# Altium footprint library Connector_Samtec_HLE_SMD.PcbLib: 290 footprints (part 9 of 24)
Each footprint in its own frame and in the unit in brackets; x right, y up, seen from the top. Pads: shape width x height; smd on the part's side, far side on the other; paste and mask are expansions set on the pad; w line width, h text height; cw(c..) or ccw(c..) is an arc to the next point about the centre after c.
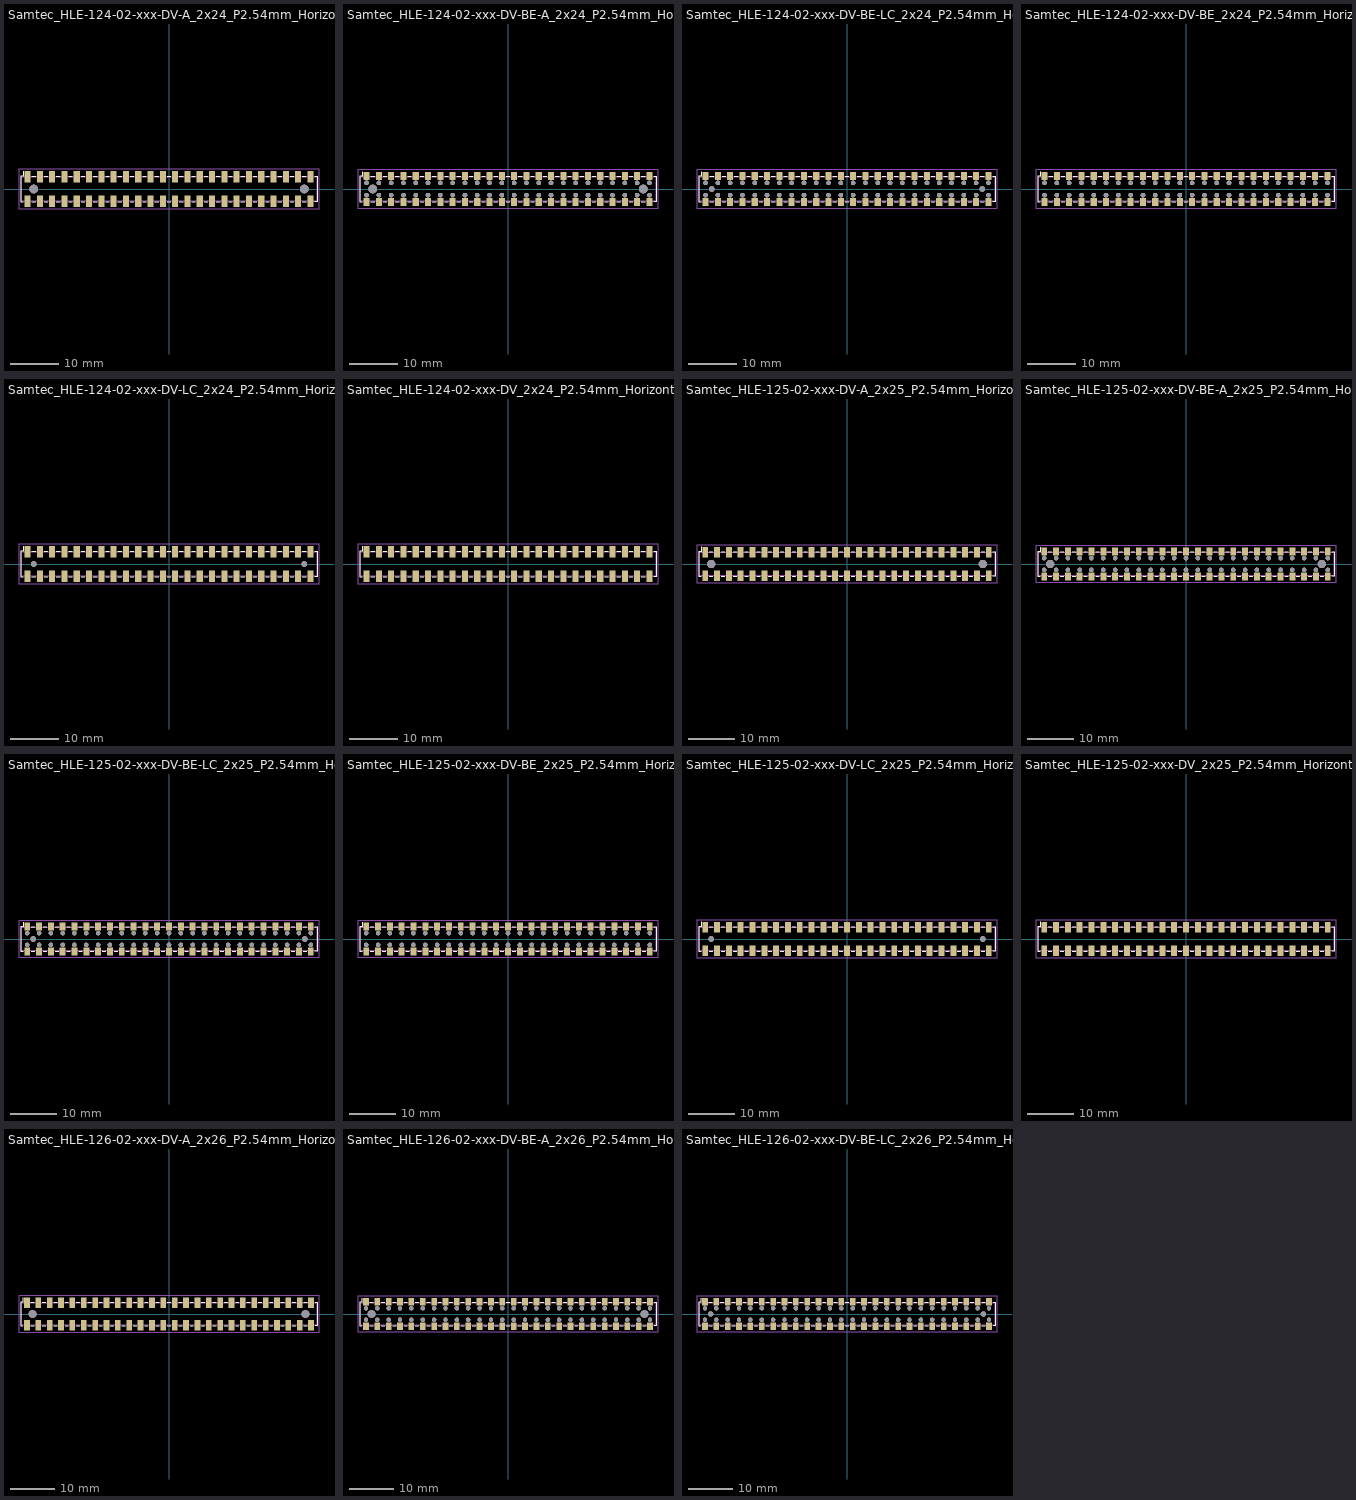
[diagram p8: the footprints below, top view; thin cyan lines are the x and y axes]

## Samtec_HLE-124-02-xxx-DV-A_2x24_P2.54mm_Horizontal [mm]
pads (50):
  rect 1.27x2.29 smd: 1(-29.21,2.525) 2(-29.21,-2.525) 3(-26.67,2.525) 4(-26.67,-2.525) 5(-24.13,2.525) 6(-24.13,-2.525) 7(-21.59,2.525) 8(-21.59,-2.525) 9(-19.05,2.525) 10(-19.05,-2.525) 11(-16.51,2.525) 12(-16.51,-2.525) 13(-13.97,2.525) 14(-13.97,-2.525) 15(-11.43,2.525) 16(-11.43,-2.525) 17(-8.89,2.525) 18(-8.89,-2.525) 19(-6.35,2.525) 20(-6.35,-2.525) 21(-3.81,2.525) 22(-3.81,-2.525) 23(-1.27,2.525) 24(-1.27,-2.525) 25(1.27,2.525) 26(1.27,-2.525) 27(3.81,2.525) 28(3.81,-2.525) 29(6.35,2.525) 30(6.35,-2.525) 31(8.89,2.525) 32(8.89,-2.525) 33(11.43,2.525) 34(11.43,-2.525) 35(13.97,2.525) 36(13.97,-2.525) 37(16.51,2.525) 38(16.51,-2.525) 39(19.05,2.525) 40(19.05,-2.525) 41(21.59,2.525) 42(21.59,-2.525) 43(24.13,2.525) 44(24.13,-2.525) 45(26.67,2.525) 46(26.67,-2.525) 47(29.21,2.525) 48(29.21,-2.525)
  round 1.78 hole 1.78: Un1(27.94,0) Un2(-27.94,0)
F.SilkS:
  lines w0.12: -30.105,-2.65 -30.59,-2.65 -30.59,2.65 -30.105,2.65 -30.105,3.67 ; -28.315,-2.65 -27.565,-2.65 ; -28.315,2.65 -27.565,2.65 ; -25.775,-2.65 -25.025,-2.65 ; -25.775,2.65 -25.025,2.65 ; -23.235,-2.65 -22.485,-2.65 ; -23.235,2.65 -22.485,2.65 ; -20.695,-2.65 -19.945,-2.65 ; -20.695,2.65 -19.945,2.65 ; -18.155,-2.65 -17.405,-2.65 ; -18.155,2.65 -17.405,2.65 ; -15.615,-2.65 -14.865,-2.65 ; -15.615,2.65 -14.865,2.65 ; -13.075,-2.65 -12.325,-2.65 ; -13.075,2.65 -12.325,2.65 ; -10.535,-2.65 -9.785,-2.65 ; -10.535,2.65 -9.785,2.65 ; -7.995,-2.65 -7.245,-2.65 ; -7.995,2.65 -7.245,2.65 ; -5.455,-2.65 -4.705,-2.65 ; -5.455,2.65 -4.705,2.65 ; -2.915,-2.65 -2.165,-2.65 ; -2.915,2.65 -2.165,2.65 ; -0.375,-2.65 0.375,-2.65 ; -0.375,2.65 0.375,2.65 ; 2.165,-2.65 2.915,-2.65 ; 2.165,2.65 2.915,2.65 ; 4.705,-2.65 5.455,-2.65 ; 4.705,2.65 5.455,2.65 ; 7.245,-2.65 7.995,-2.65 ; 7.245,2.65 7.995,2.65 ; 9.785,-2.65 10.535,-2.65 ; 9.785,2.65 10.535,2.65 ; 12.325,-2.65 13.075,-2.65 ; 12.325,2.65 13.075,2.65 ; 14.865,-2.65 15.615,-2.65 ; 14.865,2.65 15.615,2.65 ; 17.405,-2.65 18.155,-2.65 ; 17.405,2.65 18.155,2.65 ; 19.945,-2.65 20.695,-2.65 ; 19.945,2.65 20.695,2.65 ; 22.485,-2.65 23.235,-2.65 ; 22.485,2.65 23.235,2.65 ; 25.025,-2.65 25.775,-2.65 ; 25.025,2.65 25.775,2.65 ; 27.565,-2.65 28.315,-2.65 ; 27.565,2.65 28.315,2.65 ; 30.105,-2.65 30.59,-2.65 30.59,2.65 30.105,2.65
F.CrtYd:
  lines w0.05: -30.98,-4.17 30.98,-4.17 30.98,4.17 -30.98,4.17 -30.98,-4.17
F.Fab:
  lines w0.1: -29.71,2.54 -29.21,1.833 -28.71,2.54 ; -30.48,-2.54 30.48,-2.54 30.48,2.54 -30.48,2.54 -30.48,-2.54
  text "'.Designator'" at -4.047,-2.68 h1

## Samtec_HLE-124-02-xxx-DV-BE-A_2x24_P2.54mm_Horizontal [mm]
pads (98):
  rect 1.27x1.68 smd: 1(-29.21,2.72) 2(-29.21,-2.72) 3(-26.67,2.72) 4(-26.67,-2.72) 5(-24.13,2.72) 6(-24.13,-2.72) 7(-21.59,2.72) 8(-21.59,-2.72) 9(-19.05,2.72) 10(-19.05,-2.72) 11(-16.51,2.72) 12(-16.51,-2.72) 13(-13.97,2.72) 14(-13.97,-2.72) 15(-11.43,2.72) 16(-11.43,-2.72) 17(-8.89,2.72) 18(-8.89,-2.72) 19(-6.35,2.72) 20(-6.35,-2.72) 21(-3.81,2.72) 22(-3.81,-2.72) 23(-1.27,2.72) 24(-1.27,-2.72) 25(1.27,2.72) 26(1.27,-2.72) 27(3.81,2.72) 28(3.81,-2.72) 29(6.35,2.72) 30(6.35,-2.72) 31(8.89,2.72) 32(8.89,-2.72) 33(11.43,2.72) 34(11.43,-2.72) 35(13.97,2.72) 36(13.97,-2.72) 37(16.51,2.72) 38(16.51,-2.72) 39(19.05,2.72) 40(19.05,-2.72) 41(21.59,2.72) 42(21.59,-2.72) 43(24.13,2.72) 44(24.13,-2.72) 45(26.67,2.72) 46(26.67,-2.72) 47(29.21,2.72) 48(29.21,-2.72)
  round 0.97 hole 0.97: Un1(-13.97,-1.27) Un2(1.27,1.27) Un3(24.13,1.27) Un4(24.13,-1.27) Un5(-16.51,1.27) Un7(6.35,1.27) Un8(29.21,1.27) Un9(-6.35,1.27) Un11(8.89,1.27) Un12(3.81,1.27) Un13(19.05,-1.27) Un14(-29.21,-1.27) Un15(11.43,1.27) Un16(-29.21,1.27) Un17(-21.59,-1.27) Un18(3.81,-1.27) Un19(-19.05,-1.27) Un20(-8.89,1.27) Un21(-8.89,-1.27) Un22(16.51,1.27) Un23(-16.51,-1.27) Un24(-24.13,-1.27) Un25(1.27,-1.27) Un26(21.59,1.27) Un27(26.67,-1.27) Un28(-26.67,1.27) Un29(-1.27,1.27) Un30(21.59,-1.27) Un31(-11.43,-1.27) Un32(8.89,-1.27) Un33(13.97,1.27) Un34(-1.27,-1.27) Un35(-11.43,1.27) Un36(16.51,-1.27) Un37(26.67,1.27) Un38(-6.35,-1.27) Un39(-26.67,-1.27) Un40(13.97,-1.27) Un41(11.43,-1.27) Un42(6.35,-1.27) Un43(-24.13,1.27) Un44(29.21,-1.27) Un45(-3.81,1.27) Un46(-19.05,1.27) Un47(-3.81,-1.27) Un48(19.05,1.27) Un49(-21.59,1.27) Un50(-13.97,1.27)
  round 1.78 hole 1.78: Un6(-27.94,0) Un10(27.94,0)
F.SilkS:
  lines w0.12: -30.105,-2.65 -30.59,-2.65 -30.59,2.65 -30.105,2.65 -30.105,3.56 ; -28.315,-2.65 -27.565,-2.65 ; -28.315,2.65 -27.565,2.65 ; -25.775,-2.65 -25.025,-2.65 ; -25.775,2.65 -25.025,2.65 ; -23.235,-2.65 -22.485,-2.65 ; -23.235,2.65 -22.485,2.65 ; -20.695,-2.65 -19.945,-2.65 ; -20.695,2.65 -19.945,2.65 ; -18.155,-2.65 -17.405,-2.65 ; -18.155,2.65 -17.405,2.65 ; -15.615,-2.65 -14.865,-2.65 ; -15.615,2.65 -14.865,2.65 ; -13.075,-2.65 -12.325,-2.65 ; -13.075,2.65 -12.325,2.65 ; -10.535,-2.65 -9.785,-2.65 ; -10.535,2.65 -9.785,2.65 ; -7.995,-2.65 -7.245,-2.65 ; -7.995,2.65 -7.245,2.65 ; -5.455,-2.65 -4.705,-2.65 ; -5.455,2.65 -4.705,2.65 ; -2.915,-2.65 -2.165,-2.65 ; -2.915,2.65 -2.165,2.65 ; -0.375,-2.65 0.375,-2.65 ; -0.375,2.65 0.375,2.65 ; 2.165,-2.65 2.915,-2.65 ; 2.165,2.65 2.915,2.65 ; 4.705,-2.65 5.455,-2.65 ; 4.705,2.65 5.455,2.65 ; 7.245,-2.65 7.995,-2.65 ; 7.245,2.65 7.995,2.65 ; 9.785,-2.65 10.535,-2.65 ; 9.785,2.65 10.535,2.65 ; 12.325,-2.65 13.075,-2.65 ; 12.325,2.65 13.075,2.65 ; 14.865,-2.65 15.615,-2.65 ; 14.865,2.65 15.615,2.65 ; 17.405,-2.65 18.155,-2.65 ; 17.405,2.65 18.155,2.65 ; 19.945,-2.65 20.695,-2.65 ; 19.945,2.65 20.695,2.65 ; 22.485,-2.65 23.235,-2.65 ; 22.485,2.65 23.235,2.65 ; 25.025,-2.65 25.775,-2.65 ; 25.025,2.65 25.775,2.65 ; 27.565,-2.65 28.315,-2.65 ; 27.565,2.65 28.315,2.65 ; 30.105,-2.65 30.59,-2.65 30.59,2.65 30.105,2.65
F.CrtYd:
  lines w0.05: -30.98,-4.06 30.98,-4.06 30.98,4.06 -30.98,4.06 -30.98,-4.06
F.Fab:
  lines w0.1: -29.71,2.54 -29.21,1.833 -28.71,2.54 ; -30.48,-2.54 -30.48,2.54 30.48,2.54 30.48,-2.54 -30.48,-2.54
  text "'.Designator'" at -4.047,-2.68 h1

## Samtec_HLE-124-02-xxx-DV-BE-LC_2x24_P2.54mm_Horizontal [mm]
pads (98):
  rect 1.27x1.68 smd: 1(-29.21,2.72) 2(-29.21,-2.72) 3(-26.67,2.72) 4(-26.67,-2.72) 5(-24.13,2.72) 6(-24.13,-2.72) 7(-21.59,2.72) 8(-21.59,-2.72) 9(-19.05,2.72) 10(-19.05,-2.72) 11(-16.51,2.72) 12(-16.51,-2.72) 13(-13.97,2.72) 14(-13.97,-2.72) 15(-11.43,2.72) 16(-11.43,-2.72) 17(-8.89,2.72) 18(-8.89,-2.72) 19(-6.35,2.72) 20(-6.35,-2.72) 21(-3.81,2.72) 22(-3.81,-2.72) 23(-1.27,2.72) 24(-1.27,-2.72) 25(1.27,2.72) 26(1.27,-2.72) 27(3.81,2.72) 28(3.81,-2.72) 29(6.35,2.72) 30(6.35,-2.72) 31(8.89,2.72) 32(8.89,-2.72) 33(11.43,2.72) 34(11.43,-2.72) 35(13.97,2.72) 36(13.97,-2.72) 37(16.51,2.72) 38(16.51,-2.72) 39(19.05,2.72) 40(19.05,-2.72) 41(21.59,2.72) 42(21.59,-2.72) 43(24.13,2.72) 44(24.13,-2.72) 45(26.67,2.72) 46(26.67,-2.72) 47(29.21,2.72) 48(29.21,-2.72)
  round 0.97 hole 0.97: Un1(-3.81,1.27) Un2(1.27,-1.27) Un3(24.13,-1.27) Un4(-19.05,-1.27) Un5(24.13,1.27) Un6(-1.27,1.27) Un7(1.27,1.27) Un8(-11.43,-1.27) Un9(-21.59,1.27) Un10(-13.97,1.27) Un11(-13.97,-1.27) Un12(21.59,-1.27) Un13(6.35,1.27) Un14(8.89,-1.27) Un15(-11.43,1.27) Un16(-6.35,-1.27) Un17(-24.13,1.27) Un18(13.97,-1.27) Un19(-26.67,1.27) Un20(-3.81,-1.27) Un21(-26.67,-1.27) Un22(3.81,-1.27) Un24(29.21,-1.27) Un25(11.43,-1.27) Un26(26.67,-1.27) Un27(-16.51,1.27) Un28(3.81,1.27) Un29(-16.51,-1.27) Un30(16.51,1.27) Un31(-29.21,-1.27) Un32(6.35,-1.27) Un33(-6.35,1.27) Un34(11.43,1.27) Un35(29.21,1.27) Un36(-21.59,-1.27) Un37(13.97,1.27) Un38(-19.05,1.27) Un39(-24.13,-1.27) Un40(19.05,-1.27) Un42(19.05,1.27) Un43(-8.89,1.27) Un44(-29.21,1.27) Un45(-8.89,-1.27) Un46(16.51,-1.27) Un47(26.67,1.27) Un48(-1.27,-1.27) Un49(8.89,1.27) Un50(21.59,1.27)
  round 1.19 hole 1.19: Un23(-27.94,0) Un41(27.94,0)
F.SilkS:
  lines w0.12: -30.105,-2.65 -30.59,-2.65 -30.59,2.65 -30.105,2.65 -30.105,3.56 ; -28.315,-2.65 -27.565,-2.65 ; -28.315,2.65 -27.565,2.65 ; -25.775,-2.65 -25.025,-2.65 ; -25.775,2.65 -25.025,2.65 ; -23.235,-2.65 -22.485,-2.65 ; -23.235,2.65 -22.485,2.65 ; -20.695,-2.65 -19.945,-2.65 ; -20.695,2.65 -19.945,2.65 ; -18.155,-2.65 -17.405,-2.65 ; -18.155,2.65 -17.405,2.65 ; -15.615,-2.65 -14.865,-2.65 ; -15.615,2.65 -14.865,2.65 ; -13.075,-2.65 -12.325,-2.65 ; -13.075,2.65 -12.325,2.65 ; -10.535,-2.65 -9.785,-2.65 ; -10.535,2.65 -9.785,2.65 ; -7.995,-2.65 -7.245,-2.65 ; -7.995,2.65 -7.245,2.65 ; -5.455,-2.65 -4.705,-2.65 ; -5.455,2.65 -4.705,2.65 ; -2.915,-2.65 -2.165,-2.65 ; -2.915,2.65 -2.165,2.65 ; -0.375,-2.65 0.375,-2.65 ; -0.375,2.65 0.375,2.65 ; 2.165,-2.65 2.915,-2.65 ; 2.165,2.65 2.915,2.65 ; 4.705,-2.65 5.455,-2.65 ; 4.705,2.65 5.455,2.65 ; 7.245,-2.65 7.995,-2.65 ; 7.245,2.65 7.995,2.65 ; 9.785,-2.65 10.535,-2.65 ; 9.785,2.65 10.535,2.65 ; 12.325,-2.65 13.075,-2.65 ; 12.325,2.65 13.075,2.65 ; 14.865,-2.65 15.615,-2.65 ; 14.865,2.65 15.615,2.65 ; 17.405,-2.65 18.155,-2.65 ; 17.405,2.65 18.155,2.65 ; 19.945,-2.65 20.695,-2.65 ; 19.945,2.65 20.695,2.65 ; 22.485,-2.65 23.235,-2.65 ; 22.485,2.65 23.235,2.65 ; 25.025,-2.65 25.775,-2.65 ; 25.025,2.65 25.775,2.65 ; 27.565,-2.65 28.315,-2.65 ; 27.565,2.65 28.315,2.65 ; 30.105,-2.65 30.59,-2.65 30.59,2.65 30.105,2.65
F.CrtYd:
  lines w0.05: -30.98,-4.06 -30.98,4.06 30.98,4.06 30.98,-4.06 -30.98,-4.06
F.Fab:
  lines w0.1: -29.71,2.54 -29.21,1.833 -28.71,2.54 ; -30.48,-2.54 -30.48,2.54 30.48,2.54 30.48,-2.54 -30.48,-2.54
  text "'.Designator'" at -4.047,-2.68 h1

## Samtec_HLE-124-02-xxx-DV-BE_2x24_P2.54mm_Horizontal [mm]
pads (96):
  rect 1.27x1.68 smd: 1(-29.21,2.72) 2(-29.21,-2.72) 3(-26.67,2.72) 4(-26.67,-2.72) 5(-24.13,2.72) 6(-24.13,-2.72) 7(-21.59,2.72) 8(-21.59,-2.72) 9(-19.05,2.72) 10(-19.05,-2.72) 11(-16.51,2.72) 12(-16.51,-2.72) 13(-13.97,2.72) 14(-13.97,-2.72) 15(-11.43,2.72) 16(-11.43,-2.72) 17(-8.89,2.72) 18(-8.89,-2.72) 19(-6.35,2.72) 20(-6.35,-2.72) 21(-3.81,2.72) 22(-3.81,-2.72) 23(-1.27,2.72) 24(-1.27,-2.72) 25(1.27,2.72) 26(1.27,-2.72) 27(3.81,2.72) 28(3.81,-2.72) 29(6.35,2.72) 30(6.35,-2.72) 31(8.89,2.72) 32(8.89,-2.72) 33(11.43,2.72) 34(11.43,-2.72) 35(13.97,2.72) 36(13.97,-2.72) 37(16.51,2.72) 38(16.51,-2.72) 39(19.05,2.72) 40(19.05,-2.72) 41(21.59,2.72) 42(21.59,-2.72) 43(24.13,2.72) 44(24.13,-2.72) 45(26.67,2.72) 46(26.67,-2.72) 47(29.21,2.72) 48(29.21,-2.72)
  round 0.97 hole 0.97: Un1(3.81,1.27) Un2(-24.13,-1.27) Un3(11.43,-1.27) Un4(13.97,-1.27) Un5(11.43,1.27) Un6(-1.27,1.27) Un7(-3.81,1.27) Un8(-19.05,-1.27) Un9(19.05,1.27) Un10(-24.13,1.27) Un11(1.27,-1.27) Un12(16.51,1.27) Un13(-11.43,1.27) Un14(6.35,1.27) Un15(13.97,1.27) Un16(-8.89,1.27) Un17(8.89,1.27) Un18(21.59,1.27) Un19(-29.21,-1.27) Un20(-13.97,1.27) Un21(-21.59,1.27) Un22(-3.81,-1.27) Un23(29.21,-1.27) Un24(29.21,1.27) Un25(-19.05,1.27) Un26(24.13,1.27) Un27(6.35,-1.27) Un28(-26.67,-1.27) Un29(-16.51,-1.27) Un30(-6.35,-1.27) Un31(-21.59,-1.27) Un32(16.51,-1.27) Un33(1.27,1.27) Un34(26.67,1.27) Un35(8.89,-1.27) Un36(24.13,-1.27) Un37(-1.27,-1.27) Un38(-8.89,-1.27) Un39(-26.67,1.27) Un40(-29.21,1.27) Un41(19.05,-1.27) Un42(3.81,-1.27) Un43(-6.35,1.27) Un44(21.59,-1.27) Un45(26.67,-1.27) Un46(-11.43,-1.27) Un47(-13.97,-1.27) Un48(-16.51,1.27)
F.SilkS:
  lines w0.12: -30.105,-2.65 -30.59,-2.65 -30.59,2.65 -30.105,2.65 -30.105,3.56 ; -28.315,-2.65 -27.565,-2.65 ; -28.315,2.65 -27.565,2.65 ; -25.775,-2.65 -25.025,-2.65 ; -25.775,2.65 -25.025,2.65 ; -23.235,-2.65 -22.485,-2.65 ; -23.235,2.65 -22.485,2.65 ; -20.695,-2.65 -19.945,-2.65 ; -20.695,2.65 -19.945,2.65 ; -18.155,-2.65 -17.405,-2.65 ; -18.155,2.65 -17.405,2.65 ; -15.615,-2.65 -14.865,-2.65 ; -15.615,2.65 -14.865,2.65 ; -13.075,-2.65 -12.325,-2.65 ; -13.075,2.65 -12.325,2.65 ; -10.535,-2.65 -9.785,-2.65 ; -10.535,2.65 -9.785,2.65 ; -7.995,-2.65 -7.245,-2.65 ; -7.995,2.65 -7.245,2.65 ; -5.455,-2.65 -4.705,-2.65 ; -5.455,2.65 -4.705,2.65 ; -2.915,-2.65 -2.165,-2.65 ; -2.915,2.65 -2.165,2.65 ; -0.375,-2.65 0.375,-2.65 ; -0.375,2.65 0.375,2.65 ; 2.165,-2.65 2.915,-2.65 ; 2.165,2.65 2.915,2.65 ; 4.705,-2.65 5.455,-2.65 ; 4.705,2.65 5.455,2.65 ; 7.245,-2.65 7.995,-2.65 ; 7.245,2.65 7.995,2.65 ; 9.785,-2.65 10.535,-2.65 ; 9.785,2.65 10.535,2.65 ; 12.325,-2.65 13.075,-2.65 ; 12.325,2.65 13.075,2.65 ; 14.865,-2.65 15.615,-2.65 ; 14.865,2.65 15.615,2.65 ; 17.405,-2.65 18.155,-2.65 ; 17.405,2.65 18.155,2.65 ; 19.945,-2.65 20.695,-2.65 ; 19.945,2.65 20.695,2.65 ; 22.485,-2.65 23.235,-2.65 ; 22.485,2.65 23.235,2.65 ; 25.025,-2.65 25.775,-2.65 ; 25.025,2.65 25.775,2.65 ; 27.565,-2.65 28.315,-2.65 ; 27.565,2.65 28.315,2.65 ; 30.105,-2.65 30.59,-2.65 30.59,2.65 30.105,2.65
F.CrtYd:
  lines w0.05: -30.98,-4.06 -30.98,4.06 30.98,4.06 30.98,-4.06 -30.98,-4.06
F.Fab:
  lines w0.1: -29.71,2.54 -29.21,1.833 -28.71,2.54 ; -30.48,-2.54 -30.48,2.54 30.48,2.54 30.48,-2.54 -30.48,-2.54
  text "'.Designator'" at -4.047,-2.68 h1

## Samtec_HLE-124-02-xxx-DV-LC_2x24_P2.54mm_Horizontal [mm]
pads (50):
  rect 1.27x2.29 smd: 1(-29.21,2.525) 2(-29.21,-2.525) 3(-26.67,2.525) 4(-26.67,-2.525) 5(-24.13,2.525) 6(-24.13,-2.525) 7(-21.59,2.525) 8(-21.59,-2.525) 9(-19.05,2.525) 10(-19.05,-2.525) 11(-16.51,2.525) 12(-16.51,-2.525) 13(-13.97,2.525) 14(-13.97,-2.525) 15(-11.43,2.525) 16(-11.43,-2.525) 17(-8.89,2.525) 18(-8.89,-2.525) 19(-6.35,2.525) 20(-6.35,-2.525) 21(-3.81,2.525) 22(-3.81,-2.525) 23(-1.27,2.525) 24(-1.27,-2.525) 25(1.27,2.525) 26(1.27,-2.525) 27(3.81,2.525) 28(3.81,-2.525) 29(6.35,2.525) 30(6.35,-2.525) 31(8.89,2.525) 32(8.89,-2.525) 33(11.43,2.525) 34(11.43,-2.525) 35(13.97,2.525) 36(13.97,-2.525) 37(16.51,2.525) 38(16.51,-2.525) 39(19.05,2.525) 40(19.05,-2.525) 41(21.59,2.525) 42(21.59,-2.525) 43(24.13,2.525) 44(24.13,-2.525) 45(26.67,2.525) 46(26.67,-2.525) 47(29.21,2.525) 48(29.21,-2.525)
  round 1.19 hole 1.19: Un1(-27.94,0) Un2(27.94,0)
F.SilkS:
  lines w0.12: -30.105,-2.65 -30.59,-2.65 -30.59,2.65 -30.105,2.65 -30.105,3.67 ; -28.315,-2.65 -27.565,-2.65 ; -28.315,2.65 -27.565,2.65 ; -25.775,-2.65 -25.025,-2.65 ; -25.775,2.65 -25.025,2.65 ; -23.235,-2.65 -22.485,-2.65 ; -23.235,2.65 -22.485,2.65 ; -20.695,-2.65 -19.945,-2.65 ; -20.695,2.65 -19.945,2.65 ; -18.155,-2.65 -17.405,-2.65 ; -18.155,2.65 -17.405,2.65 ; -15.615,-2.65 -14.865,-2.65 ; -15.615,2.65 -14.865,2.65 ; -13.075,-2.65 -12.325,-2.65 ; -13.075,2.65 -12.325,2.65 ; -10.535,-2.65 -9.785,-2.65 ; -10.535,2.65 -9.785,2.65 ; -7.995,-2.65 -7.245,-2.65 ; -7.995,2.65 -7.245,2.65 ; -5.455,-2.65 -4.705,-2.65 ; -5.455,2.65 -4.705,2.65 ; -2.915,-2.65 -2.165,-2.65 ; -2.915,2.65 -2.165,2.65 ; -0.375,-2.65 0.375,-2.65 ; -0.375,2.65 0.375,2.65 ; 2.165,-2.65 2.915,-2.65 ; 2.165,2.65 2.915,2.65 ; 4.705,-2.65 5.455,-2.65 ; 4.705,2.65 5.455,2.65 ; 7.245,-2.65 7.995,-2.65 ; 7.245,2.65 7.995,2.65 ; 9.785,-2.65 10.535,-2.65 ; 9.785,2.65 10.535,2.65 ; 12.325,-2.65 13.075,-2.65 ; 12.325,2.65 13.075,2.65 ; 14.865,-2.65 15.615,-2.65 ; 14.865,2.65 15.615,2.65 ; 17.405,-2.65 18.155,-2.65 ; 17.405,2.65 18.155,2.65 ; 19.945,-2.65 20.695,-2.65 ; 19.945,2.65 20.695,2.65 ; 22.485,-2.65 23.235,-2.65 ; 22.485,2.65 23.235,2.65 ; 25.025,-2.65 25.775,-2.65 ; 25.025,2.65 25.775,2.65 ; 27.565,-2.65 28.315,-2.65 ; 27.565,2.65 28.315,2.65 ; 30.105,-2.65 30.59,-2.65 30.59,2.65 30.105,2.65
F.CrtYd:
  lines w0.05: -30.98,-4.17 -30.98,4.17 30.98,4.17 30.98,-4.17 -30.98,-4.17
F.Fab:
  lines w0.1: -29.71,2.54 -29.21,1.833 -28.71,2.54 ; -30.48,-2.54 30.48,-2.54 30.48,2.54 -30.48,2.54 -30.48,-2.54
  text "'.Designator'" at -4.047,-2.68 h1

## Samtec_HLE-124-02-xxx-DV_2x24_P2.54mm_Horizontal [mm]
pads (48):
  rect 1.27x2.29 smd: 1(-29.21,2.525) 2(-29.21,-2.525) 3(-26.67,2.525) 4(-26.67,-2.525) 5(-24.13,2.525) 6(-24.13,-2.525) 7(-21.59,2.525) 8(-21.59,-2.525) 9(-19.05,2.525) 10(-19.05,-2.525) 11(-16.51,2.525) 12(-16.51,-2.525) 13(-13.97,2.525) 14(-13.97,-2.525) 15(-11.43,2.525) 16(-11.43,-2.525) 17(-8.89,2.525) 18(-8.89,-2.525) 19(-6.35,2.525) 20(-6.35,-2.525) 21(-3.81,2.525) 22(-3.81,-2.525) 23(-1.27,2.525) 24(-1.27,-2.525) 25(1.27,2.525) 26(1.27,-2.525) 27(3.81,2.525) 28(3.81,-2.525) 29(6.35,2.525) 30(6.35,-2.525) 31(8.89,2.525) 32(8.89,-2.525) 33(11.43,2.525) 34(11.43,-2.525) 35(13.97,2.525) 36(13.97,-2.525) 37(16.51,2.525) 38(16.51,-2.525) 39(19.05,2.525) 40(19.05,-2.525) 41(21.59,2.525) 42(21.59,-2.525) 43(24.13,2.525) 44(24.13,-2.525) 45(26.67,2.525) 46(26.67,-2.525) 47(29.21,2.525) 48(29.21,-2.525)
F.SilkS:
  lines w0.12: -30.105,-2.65 -30.59,-2.65 -30.59,2.65 -30.105,2.65 -30.105,3.67 ; -28.315,-2.65 -27.565,-2.65 ; -28.315,2.65 -27.565,2.65 ; -25.775,-2.65 -25.025,-2.65 ; -25.775,2.65 -25.025,2.65 ; -23.235,-2.65 -22.485,-2.65 ; -23.235,2.65 -22.485,2.65 ; -20.695,-2.65 -19.945,-2.65 ; -20.695,2.65 -19.945,2.65 ; -18.155,-2.65 -17.405,-2.65 ; -18.155,2.65 -17.405,2.65 ; -15.615,-2.65 -14.865,-2.65 ; -15.615,2.65 -14.865,2.65 ; -13.075,-2.65 -12.325,-2.65 ; -13.075,2.65 -12.325,2.65 ; -10.535,-2.65 -9.785,-2.65 ; -10.535,2.65 -9.785,2.65 ; -7.995,-2.65 -7.245,-2.65 ; -7.995,2.65 -7.245,2.65 ; -5.455,-2.65 -4.705,-2.65 ; -5.455,2.65 -4.705,2.65 ; -2.915,-2.65 -2.165,-2.65 ; -2.915,2.65 -2.165,2.65 ; -0.375,-2.65 0.375,-2.65 ; -0.375,2.65 0.375,2.65 ; 2.165,-2.65 2.915,-2.65 ; 2.165,2.65 2.915,2.65 ; 4.705,-2.65 5.455,-2.65 ; 4.705,2.65 5.455,2.65 ; 7.245,-2.65 7.995,-2.65 ; 7.245,2.65 7.995,2.65 ; 9.785,-2.65 10.535,-2.65 ; 9.785,2.65 10.535,2.65 ; 12.325,-2.65 13.075,-2.65 ; 12.325,2.65 13.075,2.65 ; 14.865,-2.65 15.615,-2.65 ; 14.865,2.65 15.615,2.65 ; 17.405,-2.65 18.155,-2.65 ; 17.405,2.65 18.155,2.65 ; 19.945,-2.65 20.695,-2.65 ; 19.945,2.65 20.695,2.65 ; 22.485,-2.65 23.235,-2.65 ; 22.485,2.65 23.235,2.65 ; 25.025,-2.65 25.775,-2.65 ; 25.025,2.65 25.775,2.65 ; 27.565,-2.65 28.315,-2.65 ; 27.565,2.65 28.315,2.65 ; 30.105,-2.65 30.59,-2.65 30.59,2.65 30.105,2.65
F.CrtYd:
  lines w0.05: -30.98,-4.17 30.98,-4.17 30.98,4.17 -30.98,4.17 -30.98,-4.17
F.Fab:
  lines w0.1: -29.71,2.54 -29.21,1.833 -28.71,2.54 ; -30.48,-2.54 30.48,-2.54 30.48,2.54 -30.48,2.54 -30.48,-2.54
  text "'.Designator'" at -4.047,-2.68 h1

## Samtec_HLE-125-02-xxx-DV-A_2x25_P2.54mm_Horizontal [mm]
pads (52):
  rect 1.27x2.29 smd: 1(-30.48,2.525) 2(-30.48,-2.525) 3(-27.94,2.525) 4(-27.94,-2.525) 5(-25.4,2.525) 6(-25.4,-2.525) 7(-22.86,2.525) 8(-22.86,-2.525) 9(-20.32,2.525) 10(-20.32,-2.525) 11(-17.78,2.525) 12(-17.78,-2.525) 13(-15.24,2.525) 14(-15.24,-2.525) 15(-12.7,2.525) 16(-12.7,-2.525) 17(-10.16,2.525) 18(-10.16,-2.525) 19(-7.62,2.525) 20(-7.62,-2.525) 21(-5.08,2.525) 22(-5.08,-2.525) 23(-2.54,2.525) 24(-2.54,-2.525) 25(0,2.525) 26(0,-2.525) 27(2.54,2.525) 28(2.54,-2.525) 29(5.08,2.525) 30(5.08,-2.525) 31(7.62,2.525) 32(7.62,-2.525) 33(10.16,2.525) 34(10.16,-2.525) 35(12.7,2.525) 36(12.7,-2.525) 37(15.24,2.525) 38(15.24,-2.525) 39(17.78,2.525) 40(17.78,-2.525) 41(20.32,2.525) 42(20.32,-2.525) 43(22.86,2.525) 44(22.86,-2.525) 45(25.4,2.525) 46(25.4,-2.525) 47(27.94,2.525) 48(27.94,-2.525) 49(30.48,2.525) 50(30.48,-2.525)
  round 1.78 hole 1.78: Un1(-29.21,0) Un2(29.21,0)
F.SilkS:
  lines w0.12: -31.375,-2.65 -31.86,-2.65 -31.86,2.65 -31.375,2.65 -31.375,3.67 ; -29.585,-2.65 -28.835,-2.65 ; -29.585,2.65 -28.835,2.65 ; -27.045,-2.65 -26.295,-2.65 ; -27.045,2.65 -26.295,2.65 ; -24.505,-2.65 -23.755,-2.65 ; -24.505,2.65 -23.755,2.65 ; -21.965,-2.65 -21.215,-2.65 ; -21.965,2.65 -21.215,2.65 ; -19.425,-2.65 -18.675,-2.65 ; -19.425,2.65 -18.675,2.65 ; -16.885,-2.65 -16.135,-2.65 ; -16.885,2.65 -16.135,2.65 ; -14.345,-2.65 -13.595,-2.65 ; -14.345,2.65 -13.595,2.65 ; -11.805,-2.65 -11.055,-2.65 ; -11.805,2.65 -11.055,2.65 ; -9.265,-2.65 -8.515,-2.65 ; -9.265,2.65 -8.515,2.65 ; -6.725,-2.65 -5.975,-2.65 ; -6.725,2.65 -5.975,2.65 ; -4.185,-2.65 -3.435,-2.65 ; -4.185,2.65 -3.435,2.65 ; -1.645,-2.65 -0.895,-2.65 ; -1.645,2.65 -0.895,2.65 ; 0.895,-2.65 1.645,-2.65 ; 0.895,2.65 1.645,2.65 ; 3.435,-2.65 4.185,-2.65 ; 3.435,2.65 4.185,2.65 ; 5.975,-2.65 6.725,-2.65 ; 5.975,2.65 6.725,2.65 ; 8.515,-2.65 9.265,-2.65 ; 8.515,2.65 9.265,2.65 ; 11.055,-2.65 11.805,-2.65 ; 11.055,2.65 11.805,2.65 ; 13.595,-2.65 14.345,-2.65 ; 13.595,2.65 14.345,2.65 ; 16.135,-2.65 16.885,-2.65 ; 16.135,2.65 16.885,2.65 ; 18.675,-2.65 19.425,-2.65 ; 18.675,2.65 19.425,2.65 ; 21.215,-2.65 21.965,-2.65 ; 21.215,2.65 21.965,2.65 ; 23.755,-2.65 24.505,-2.65 ; 23.755,2.65 24.505,2.65 ; 26.295,-2.65 27.045,-2.65 ; 26.295,2.65 27.045,2.65 ; 28.835,-2.65 29.585,-2.65 ; 28.835,2.65 29.585,2.65 ; 31.375,-2.65 31.86,-2.65 31.86,2.65 31.375,2.65
F.CrtYd:
  lines w0.05: -32.25,-4.17 32.25,-4.17 32.25,4.17 -32.25,4.17 -32.25,-4.17
F.Fab:
  lines w0.1: -30.98,2.54 -30.48,1.833 -29.98,2.54 ; -31.75,-2.54 31.75,-2.54 31.75,2.54 -31.75,2.54 -31.75,-2.54
  text "'.Designator'" at -4.047,-2.68 h1
